# Altium schematic symbol library jlcpcb_2025_04_capacitors_extended_1206.schlib: 2503 symbols (part 14 of 14) (continued)
## TCC1206X7R681K501DT
designator C?  Capacitance: 680pF  (hidden comment: *)
Capacitor, Ceramic (MLCC), 680pF, ±10%, 500V, X7R, ±10%, SMD 1206; Manufacturer: CCTC; Manufacturer Part Number: TCC1206X7R681K501DT; Package Size: 1206; JLCPCB Basic Part: No; JLCPCB Part Number: C377115; Supplier 1: LCSC; Category: Capacitors - MLCC; Supplier Part Number 1: C377115; Tolerance: ±10%; Voltage Rating: 500V; Temperature Coefficient: X7R; RoHS: Yes; ComponentLink1Description: Datasheet; ComponentLink1URL: https://wmsc.lcsc.com/wmsc/upload/file/pdf/v2/lcsc/2304140030_CCTC-TCC1206X7R681K501DT_C377115.pdf; ComponentLink2Description: JLCPCB Part URL; ComponentLink2URL: https://jlcpcb.com/partdetail/C377115; ComponentLink3Description: LCSC Part URL; ComponentLink3URL: https://lcsc.com/product-detail/Multilayer-Ceramic-Capacitors-MLCC---SMD-SMT_CCTC-CCTC-TCC1206X7R681K501DT_C377115.html
footprint CAP-1206 (1206 (3216M) Capacitor)
pins: 1, 2

## TCC1206X7R682K102FT
designator C?  Capacitance: 6.8nF  (hidden comment: *)
Capacitor, Ceramic (MLCC), 6.8nF, ±10%, 1kV, X7R, ±10%, SMD 1206; Manufacturer: CCTC; Manufacturer Part Number: TCC1206X7R682K102FT; Package Size: 1206; JLCPCB Basic Part: No; JLCPCB Part Number: C377116; Supplier 1: LCSC; Category: Capacitors - MLCC; Supplier Part Number 1: C377116; Tolerance: ±10%; Voltage Rating: 1kV; Temperature Coefficient: X7R; RoHS: Yes; ComponentLink1Description: Datasheet; ComponentLink1URL: https://wmsc.lcsc.com/wmsc/upload/file/pdf/v2/lcsc/2304140030_CCTC-TCC1206X7R682K102FT_C377116.pdf; ComponentLink2Description: JLCPCB Part URL; ComponentLink2URL: https://jlcpcb.com/partdetail/C377116; ComponentLink3Description: LCSC Part URL; ComponentLink3URL: https://lcsc.com/product-detail/Multilayer-Ceramic-Capacitors-MLCC---SMD-SMT_CCTC-CCTC-TCC1206X7R682K102FT_C377116.html
footprint CAP-1206 (1206 (3216M) Capacitor)
pins: 1, 2

## TCC1206X7R683K500DT
designator C?  Capacitance: 68nF  (hidden comment: *)
Capacitor, Ceramic (MLCC), 68nF, ±10%, 50V, X7R, ±10%, SMD 1206; Manufacturer: CCTC; Manufacturer Part Number: TCC1206X7R683K500DT; Package Size: 1206; JLCPCB Basic Part: No; JLCPCB Part Number: C282881; Supplier 1: LCSC; Category: Capacitors - MLCC; Supplier Part Number 1: C282881; Tolerance: ±10%; Voltage Rating: 50V; Temperature Coefficient: X7R; RoHS: Yes; ComponentLink1Description: Datasheet; ComponentLink1URL: https://wmsc.lcsc.com/wmsc/upload/file/pdf/v2/lcsc/2304140030_CCTC-TCC1206X7R683K500DT_C282881.pdf; ComponentLink2Description: JLCPCB Part URL; ComponentLink2URL: https://jlcpcb.com/partdetail/C282881; ComponentLink3Description: LCSC Part URL; ComponentLink3URL: https://lcsc.com/product-detail/Multilayer-Ceramic-Capacitors-MLCC---SMD-SMT_CCTC-CCTC-TCC1206X7R683K500DT_C282881.html
footprint CAP-1206 (1206 (3216M) Capacitor)
pins: 1, 2

## TCC1206X7R683K501HT
designator C?  Capacitance: 68nF  (hidden comment: *)
Capacitor, Ceramic (MLCC), 68nF, ±10%, 500V, X7R, ±10%, SMD 1206; Manufacturer: CCTC; Manufacturer Part Number: TCC1206X7R683K501HT; Package Size: 1206; JLCPCB Basic Part: No; JLCPCB Part Number: C7393999; Supplier 1: LCSC; Category: Capacitors - MLCC; Supplier Part Number 1: C7393999; Tolerance: ±10%; Voltage Rating: 500V; Temperature Coefficient: X7R; RoHS: Yes; ComponentLink1Description: Datasheet; ComponentLink1URL: https://wmsc.lcsc.com/wmsc/upload/file/pdf/v2/lcsc/2306211528_CCTC-TCC1206X7R683K501HT_C7393999.pdf; ComponentLink2Description: JLCPCB Part URL; ComponentLink2URL: https://jlcpcb.com/partdetail/C7393999; ComponentLink3Description: LCSC Part URL; ComponentLink3URL: https://lcsc.com/product-detail/Multilayer-Ceramic-Capacitors-MLCC---SMD-SMT_CCTC-CCTC-TCC1206X7R683K501HT_C7393999.html
footprint CAP-1206 (1206 (3216M) Capacitor)
pins: 1, 2

## TCC1206X7R684K500FT
designator C?  Capacitance: 680nF  (hidden comment: *)
Capacitor, Ceramic (MLCC), 680nF, ±10%, 50V, X7R, ±10%, SMD 1206; Manufacturer: CCTC; Manufacturer Part Number: TCC1206X7R684K500FT; Package Size: 1206; JLCPCB Basic Part: No; JLCPCB Part Number: C377117; Supplier 1: LCSC; Category: Capacitors - MLCC; Supplier Part Number 1: C377117; Tolerance: ±10%; Voltage Rating: 50V; Temperature Coefficient: X7R; RoHS: Yes; ComponentLink1Description: Datasheet; ComponentLink1URL: https://wmsc.lcsc.com/wmsc/upload/file/pdf/v2/lcsc/2304140030_CCTC-TCC1206X7R684K500FT_C377117.pdf; ComponentLink2Description: JLCPCB Part URL; ComponentLink2URL: https://jlcpcb.com/partdetail/C377117; ComponentLink3Description: LCSC Part URL; ComponentLink3URL: https://lcsc.com/product-detail/Multilayer-Ceramic-Capacitors-MLCC---SMD-SMT_CCTC-CCTC-TCC1206X7R684K500FT_C377117.html
footprint CAP-1206 (1206 (3216M) Capacitor)
pins: 1, 2

## TCC1206X7R822K500DT
designator C?  Capacitance: 8.2nF  (hidden comment: *)
Capacitor, Ceramic (MLCC), 8.2nF, ±10%, 50V, X7R, ±10%, SMD 1206; Manufacturer: CCTC; Manufacturer Part Number: TCC1206X7R822K500DT; Package Size: 1206; JLCPCB Basic Part: No; JLCPCB Part Number: C282884; Supplier 1: LCSC; Category: Capacitors - MLCC; Supplier Part Number 1: C282884; Tolerance: ±10%; Voltage Rating: 50V; Temperature Coefficient: X7R; RoHS: Yes; ComponentLink1Description: Datasheet; ComponentLink1URL: https://wmsc.lcsc.com/wmsc/upload/file/pdf/v2/lcsc/2304140030_CCTC-TCC1206X7R822K500DT_C282884.pdf; ComponentLink2Description: JLCPCB Part URL; ComponentLink2URL: https://jlcpcb.com/partdetail/C282884; ComponentLink3Description: LCSC Part URL; ComponentLink3URL: https://lcsc.com/product-detail/Multilayer-Ceramic-Capacitors-MLCC---SMD-SMT_CCTC-CCTC-TCC1206X7R822K500DT_C282884.html
footprint CAP-1206 (1206 (3216M) Capacitor)
pins: 1, 2

## TCC1206X7R823K251FT
designator C?  Capacitance: 82nF  (hidden comment: *)
Capacitor, Ceramic (MLCC), 82nF, ±10%, 250V, X7R, ±10%, SMD 1206; Manufacturer: CCTC; Manufacturer Part Number: TCC1206X7R823K251FT; Package Size: 1206; JLCPCB Basic Part: No; JLCPCB Part Number: C7394002; Supplier 1: LCSC; Category: Capacitors - MLCC; Supplier Part Number 1: C7394002; Tolerance: ±10%; Voltage Rating: 250V; Temperature Coefficient: X7R; RoHS: Yes; ComponentLink1Description: Datasheet; ComponentLink1URL: https://wmsc.lcsc.com/wmsc/upload/file/pdf/v2/lcsc/2306061505_CCTC-TCC1206X7R823K251FT_C7394002.pdf; ComponentLink2Description: JLCPCB Part URL; ComponentLink2URL: https://jlcpcb.com/partdetail/C7394002; ComponentLink3Description: LCSC Part URL; ComponentLink3URL: https://lcsc.com/product-detail/Multilayer-Ceramic-Capacitors-MLCC---SMD-SMT_CCTC-CCTC-TCC1206X7R823K251FT_C7394002.html
footprint CAP-1206 (1206 (3216M) Capacitor)
pins: 1, 2

## TCC1206X7R823K500DT
designator C?  Capacitance: 82nF  (hidden comment: *)
Capacitor, Ceramic (MLCC), 82nF, ±10%, 50V, X7R, ±10%, SMD 1206; Manufacturer: CCTC; Manufacturer Part Number: TCC1206X7R823K500DT; Package Size: 1206; JLCPCB Basic Part: No; JLCPCB Part Number: C282885; Supplier 1: LCSC; Category: Capacitors - MLCC; Supplier Part Number 1: C282885; Tolerance: ±10%; Voltage Rating: 50V; Temperature Coefficient: X7R; RoHS: Yes; ComponentLink1Description: Datasheet; ComponentLink1URL: https://wmsc.lcsc.com/wmsc/upload/file/pdf/v2/lcsc/2304140030_CCTC-TCC1206X7R823K500DT_C282885.pdf; ComponentLink2Description: JLCPCB Part URL; ComponentLink2URL: https://jlcpcb.com/partdetail/C282885; ComponentLink3Description: LCSC Part URL; ComponentLink3URL: https://lcsc.com/product-detail/Multilayer-Ceramic-Capacitors-MLCC---SMD-SMT_CCTC-CCTC-TCC1206X7R823K500DT_C282885.html
footprint CAP-1206 (1206 (3216M) Capacitor)
pins: 1, 2

## TMK316AB7106KL-T
designator C?  Capacitance: 10uF  (hidden comment: *)
Capacitor, Ceramic (MLCC), 10uF, ±10%, 25V, X7R, ±10%, SMD 1206; Manufacturer: Taiyo Yuden; Manufacturer Part Number: TMK316AB7106KL-T; Package Size: 1206; JLCPCB Basic Part: No; JLCPCB Part Number: C337446; Supplier 1: LCSC; Category: Capacitors - MLCC; Supplier Part Number 1: C337446; Tolerance: ±10%; Voltage Rating: 25V; Temperature Coefficient: X7R; RoHS: Yes; ComponentLink1Description: Datasheet; ComponentLink1URL: https://wmsc.lcsc.com/wmsc/upload/file/pdf/v2/lcsc/2304140030_Taiyo-Yuden-TMK316AB7106KL-T_C337446.pdf; ComponentLink2Description: JLCPCB Part URL; ComponentLink2URL: https://jlcpcb.com/partdetail/C337446; ComponentLink3Description: LCSC Part URL; ComponentLink3URL: https://lcsc.com/product-detail/Multilayer-Ceramic-Capacitors-MLCC---SMD-SMT_Taiyo-Yuden-Taiyo-Yuden-TMK316AB7106KL-T_C337446.html
footprint CAP-1206 (1206 (3216M) Capacitor)
pins: 1, 2

## TMK316AB7475KD-T
designator C?  Capacitance: 4.7uF  (hidden comment: *)
Capacitor, Ceramic (MLCC), 4.7uF, ±10%, 25V, X7R, ±10%, SMD 1206; Manufacturer: Taiyo Yuden; Manufacturer Part Number: TMK316AB7475KD-T; Package Size: 1206; JLCPCB Basic Part: No; JLCPCB Part Number: C2171046; Supplier 1: LCSC; Category: Capacitors - MLCC; Supplier Part Number 1: C2171046; Tolerance: ±10%; Voltage Rating: 25V; Temperature Coefficient: X7R; RoHS: Yes; ComponentLink1Description: Datasheet; ComponentLink1URL: https://wmsc.lcsc.com/wmsc/upload/file/pdf/v2/lcsc/2211282030_Taiyo-Yuden-TMK316AB7475KD-T_C2171046.pdf; ComponentLink2Description: JLCPCB Part URL; ComponentLink2URL: https://jlcpcb.com/partdetail/C2171046; ComponentLink3Description: LCSC Part URL; ComponentLink3URL: https://lcsc.com/product-detail/Multilayer-Ceramic-Capacitors-MLCC---SMD-SMT_Taiyo-Yuden-Taiyo-Yuden-TMK316AB7475KD-T_C2171046.html
footprint CAP-1206 (1206 (3216M) Capacitor)
pins: 1, 2

## TMK316AB7475KL-T
designator C?  Capacitance: 4.7uF  (hidden comment: *)
Capacitor, Ceramic (MLCC), 4.7uF, ±10%, 25V, X7R, ±10%, SMD 1206; Manufacturer: Taiyo Yuden; Manufacturer Part Number: TMK316AB7475KL-T; Package Size: 1206; JLCPCB Basic Part: No; JLCPCB Part Number: C337441; Supplier 1: LCSC; Category: Capacitors - MLCC; Supplier Part Number 1: C337441; Tolerance: ±10%; Voltage Rating: 25V; Temperature Coefficient: X7R; RoHS: Yes; ComponentLink1Description: Datasheet; ComponentLink1URL: https://wmsc.lcsc.com/wmsc/upload/file/pdf/v2/lcsc/2304140030_Taiyo-Yuden-TMK316AB7475KL-T_C337441.pdf; ComponentLink2Description: JLCPCB Part URL; ComponentLink2URL: https://jlcpcb.com/partdetail/C337441; ComponentLink3Description: LCSC Part URL; ComponentLink3URL: https://lcsc.com/product-detail/Multilayer-Ceramic-Capacitors-MLCC---SMD-SMT_Taiyo-Yuden-Taiyo-Yuden-TMK316AB7475KL-T_C337441.html
footprint CAP-1206 (1206 (3216M) Capacitor)
pins: 1, 2

## TMK316AB7475KLHT
designator C?  Capacitance: 4.7uF  (hidden comment: *)
Capacitor, Ceramic (MLCC), 4.7uF, ±10%, 25V, X7R, ±10%, SMD 1206; Manufacturer: Taiyo Yuden; Manufacturer Part Number: TMK316AB7475KLHT; Package Size: 1206; JLCPCB Basic Part: No; JLCPCB Part Number: C386090; Supplier 1: LCSC; Category: Capacitors - MLCC; Supplier Part Number 1: C386090; Tolerance: ±10%; Voltage Rating: 25V; Temperature Coefficient: X7R; RoHS: Yes; ComponentLink1Description: Datasheet; ComponentLink1URL: https://wmsc.lcsc.com/wmsc/upload/file/pdf/v2/lcsc/2211282230_Taiyo-Yuden-TMK316AB7475KLHT_C386090.pdf; ComponentLink2Description: JLCPCB Part URL; ComponentLink2URL: https://jlcpcb.com/partdetail/C386090; ComponentLink3Description: LCSC Part URL; ComponentLink3URL: https://lcsc.com/product-detail/Multilayer-Ceramic-Capacitors-MLCC---SMD-SMT_Taiyo-Yuden-Taiyo-Yuden-TMK316AB7475KLHT_C386090.html
footprint CAP-1206 (1206 (3216M) Capacitor)
pins: 1, 2

## TMK316B7106KL-TD
designator C?  Capacitance: 10uF  (hidden comment: *)
Capacitor, Ceramic (MLCC), 10uF, ±10%, 25V, X7R, ±10%, SMD 1206; Manufacturer: Taiyo Yuden; Manufacturer Part Number: TMK316B7106KL-TD; Package Size: 1206; JLCPCB Basic Part: No; JLCPCB Part Number: C92831; Supplier 1: LCSC; Category: Capacitors - MLCC; Supplier Part Number 1: C92831; Tolerance: ±10%; Voltage Rating: 25V; Temperature Coefficient: X7R; RoHS: Yes; ComponentLink1Description: Datasheet; ComponentLink1URL: https://wmsc.lcsc.com/wmsc/upload/file/pdf/v2/lcsc/2304140030_Taiyo-Yuden-TMK316B7106KL-TD_C92831.pdf; ComponentLink2Description: JLCPCB Part URL; ComponentLink2URL: https://jlcpcb.com/partdetail/C92831; ComponentLink3Description: LCSC Part URL; ComponentLink3URL: https://lcsc.com/product-detail/Multilayer-Ceramic-Capacitors-MLCC---SMD-SMT_Taiyo-Yuden-Taiyo-Yuden-TMK316B7106KL-TD_C92831.html
footprint CAP-1206 (1206 (3216M) Capacitor)
pins: 1, 2

## TMK316B7225KL-T
designator C?  Capacitance: 2.2uF  (hidden comment: *)
Capacitor, Ceramic (MLCC), 2.2uF, ±10%, 25V, X7R, ±10%, SMD 1206; Manufacturer: Taiyo Yuden; Manufacturer Part Number: TMK316B7225KL-T; Package Size: 1206; JLCPCB Basic Part: No; JLCPCB Part Number: C386092; Supplier 1: LCSC; Category: Capacitors - MLCC; Supplier Part Number 1: C386092; Tolerance: ±10%; Voltage Rating: 25V; Temperature Coefficient: X7R; RoHS: Yes; ComponentLink1Description: Datasheet; ComponentLink1URL: https://wmsc.lcsc.com/wmsc/upload/file/pdf/v2/lcsc/2304140030_Taiyo-Yuden-TMK316B7225KL-T_C386092.pdf; ComponentLink2Description: JLCPCB Part URL; ComponentLink2URL: https://jlcpcb.com/partdetail/C386092; ComponentLink3Description: LCSC Part URL; ComponentLink3URL: https://lcsc.com/product-detail/Multilayer-Ceramic-Capacitors-MLCC---SMD-SMT_Taiyo-Yuden-Taiyo-Yuden-TMK316B7225KL-T_C386092.html
footprint CAP-1206 (1206 (3216M) Capacitor)
pins: 1, 2

## TMK316B7225KLHT
designator C?  Capacitance: 2.2uF  (hidden comment: *)
Capacitor, Ceramic (MLCC), 2.2uF, ±10%, 25V, X7R, ±10%, SMD 1206; Manufacturer: Taiyo Yuden; Manufacturer Part Number: TMK316B7225KLHT; Package Size: 1206; JLCPCB Basic Part: No; JLCPCB Part Number: C655210; Supplier 1: LCSC; Category: Capacitors - MLCC; Supplier Part Number 1: C655210; Tolerance: ±10%; Voltage Rating: 25V; Temperature Coefficient: X7R; RoHS: Yes; ComponentLink1Description: Datasheet; ComponentLink1URL: https://wmsc.lcsc.com/wmsc/upload/file/pdf/v2/lcsc/2304140030_Taiyo-Yuden-TMK316B7225KLHT_C655210.pdf; ComponentLink2Description: JLCPCB Part URL; ComponentLink2URL: https://jlcpcb.com/partdetail/C655210; ComponentLink3Description: LCSC Part URL; ComponentLink3URL: https://lcsc.com/product-detail/Multilayer-Ceramic-Capacitors-MLCC---SMD-SMT_Taiyo-Yuden-Taiyo-Yuden-TMK316B7225KLHT_C655210.html
footprint CAP-1206 (1206 (3216M) Capacitor)
pins: 1, 2

## TMK316BBJ226KL-T
designator C?  Capacitance: 22uF  (hidden comment: *)
Capacitor, Ceramic (MLCC), 22uF, ±10%, 25V, ±10%, SMD 1206; Manufacturer: Taiyo Yuden; Manufacturer Part Number: TMK316BBJ226KL-T; Package Size: 1206; JLCPCB Basic Part: No; JLCPCB Part Number: C778724; Supplier 1: LCSC; Category: Capacitors - MLCC; Supplier Part Number 1: C778724; Tolerance: ±10%; Voltage Rating: 25V; RoHS: Yes; ComponentLink1Description: Datasheet; ComponentLink1URL: https://wmsc.lcsc.com/wmsc/upload/file/pdf/v2/lcsc/2304140030_Taiyo-Yuden-TMK316BBJ226KL-T_C778724.pdf; ComponentLink2Description: JLCPCB Part URL; ComponentLink2URL: https://jlcpcb.com/partdetail/C778724; ComponentLink3Description: LCSC Part URL; ComponentLink3URL: https://lcsc.com/product-detail/Multilayer-Ceramic-Capacitors-MLCC---SMD-SMT_Taiyo-Yuden-Taiyo-Yuden-TMK316BBJ226KL-T_C778724.html
footprint CAP-1206 (1206 (3216M) Capacitor)
pins: 1, 2

## TMK316BBJ226ML-T
designator C?  Capacitance: 22uF  (hidden comment: *)
Capacitor, Ceramic (MLCC), 22uF, ±20%, 25V, X5R, ±20%, SMD 1206; Manufacturer: Taiyo Yuden; Manufacturer Part Number: TMK316BBJ226ML-T; Package Size: 1206; JLCPCB Basic Part: No; JLCPCB Part Number: C386093; Supplier 1: LCSC; Category: Capacitors - MLCC; Supplier Part Number 1: C386093; Tolerance: ±20%; Voltage Rating: 25V; Temperature Coefficient: X5R; RoHS: Yes; ComponentLink1Description: Datasheet; ComponentLink1URL: https://wmsc.lcsc.com/wmsc/upload/file/pdf/v2/lcsc/2304140030_Taiyo-Yuden-TMK316BBJ226ML-T_C386093.pdf; ComponentLink2Description: JLCPCB Part URL; ComponentLink2URL: https://jlcpcb.com/partdetail/C386093; ComponentLink3Description: LCSC Part URL; ComponentLink3URL: https://lcsc.com/product-detail/Multilayer-Ceramic-Capacitors-MLCC---SMD-SMT_Taiyo-Yuden-Taiyo-Yuden-TMK316BBJ226ML-T_C386093.html
footprint CAP-1206 (1206 (3216M) Capacitor)
pins: 1, 2

## TMK316BJ105KD-T
designator C?  Capacitance: 1uF  (hidden comment: *)
Capacitor, Ceramic (MLCC), 1uF, ±10%, 25V, X5R, ±10%, SMD 1206; Manufacturer: Taiyo Yuden; Manufacturer Part Number: TMK316BJ105KD-T; Package Size: 1206; JLCPCB Basic Part: No; JLCPCB Part Number: C412632; Supplier 1: LCSC; Category: Capacitors - MLCC; Supplier Part Number 1: C412632; Tolerance: ±10%; Voltage Rating: 25V; Temperature Coefficient: X5R; RoHS: Yes; ComponentLink1Description: Datasheet; ComponentLink1URL: https://wmsc.lcsc.com/wmsc/upload/file/pdf/v2/lcsc/2304140030_Taiyo-Yuden-TMK316BJ105KD-T_C412632.pdf; ComponentLink2Description: JLCPCB Part URL; ComponentLink2URL: https://jlcpcb.com/partdetail/C412632; ComponentLink3Description: LCSC Part URL; ComponentLink3URL: https://lcsc.com/product-detail/Multilayer-Ceramic-Capacitors-MLCC---SMD-SMT_Taiyo-Yuden-Taiyo-Yuden-TMK316BJ105KD-T_C412632.html
footprint CAP-1206 (1206 (3216M) Capacitor)
pins: 1, 2

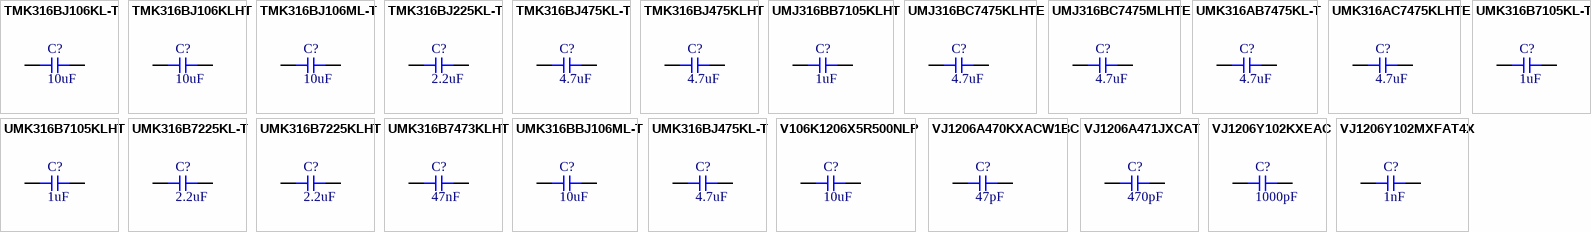
[diagram p62: symbols TMK316BJ106KL-T to VJ1206Y102MXFAT4X]

## TMK316BJ106KL-T
designator C?  Capacitance: 10uF  (hidden comment: *)
Capacitor, Ceramic (MLCC), 10uF, ±10%, 25V, X5R, ±10%, SMD 1206; Manufacturer: Taiyo Yuden; Manufacturer Part Number: TMK316BJ106KL-T; Package Size: 1206; JLCPCB Basic Part: No; JLCPCB Part Number: C87161; Supplier 1: LCSC; Category: Capacitors - MLCC; Supplier Part Number 1: C87161; Tolerance: ±10%; Voltage Rating: 25V; Temperature Coefficient: X5R; RoHS: Yes; ComponentLink1Description: Datasheet; ComponentLink1URL: https://wmsc.lcsc.com/wmsc/upload/file/pdf/v2/lcsc/2304140030_Taiyo-Yuden-TMK316BJ106KL-T_C87161.pdf; ComponentLink2Description: JLCPCB Part URL; ComponentLink2URL: https://jlcpcb.com/partdetail/C87161; ComponentLink3Description: LCSC Part URL; ComponentLink3URL: https://lcsc.com/product-detail/Multilayer-Ceramic-Capacitors-MLCC---SMD-SMT_Taiyo-Yuden-Taiyo-Yuden-TMK316BJ106KL-T_C87161.html
footprint CAP-1206 (1206 (3216M) Capacitor)
pins: 1, 2

## TMK316BJ106KLHT
designator C?  Capacitance: 10uF  (hidden comment: *)
Capacitor, Ceramic (MLCC), 10uF, ±10%, 25V, X5R, ±10%, SMD 1206; Manufacturer: Taiyo Yuden; Manufacturer Part Number: TMK316BJ106KLHT; Package Size: 1206; JLCPCB Basic Part: No; JLCPCB Part Number: C841053; Supplier 1: LCSC; Category: Capacitors - MLCC; Supplier Part Number 1: C841053; Tolerance: ±10%; Voltage Rating: 25V; Temperature Coefficient: X5R; RoHS: Yes; ComponentLink1Description: Datasheet; ComponentLink1URL: https://wmsc.lcsc.com/wmsc/upload/file/pdf/v2/lcsc/2010231636_Taiyo-Yuden-TMK316BJ106KLHT_C841053.pdf; ComponentLink2Description: JLCPCB Part URL; ComponentLink2URL: https://jlcpcb.com/partdetail/C841053; ComponentLink3Description: LCSC Part URL; ComponentLink3URL: https://lcsc.com/product-detail/Multilayer-Ceramic-Capacitors-MLCC---SMD-SMT_Taiyo-Yuden-Taiyo-Yuden-TMK316BJ106KLHT_C841053.html
footprint CAP-1206 (1206 (3216M) Capacitor)
pins: 1, 2

## TMK316BJ106ML-T
designator C?  Capacitance: 10uF  (hidden comment: *)
Capacitor, Ceramic (MLCC), 10uF, ±20%, 25V, X5R, ±20%, SMD 1206; Manufacturer: Taiyo Yuden; Manufacturer Part Number: TMK316BJ106ML-T; Package Size: 1206; JLCPCB Basic Part: No; JLCPCB Part Number: C311699; Supplier 1: LCSC; Category: Capacitors - MLCC; Supplier Part Number 1: C311699; Tolerance: ±20%; Voltage Rating: 25V; Temperature Coefficient: X5R; RoHS: Yes; ComponentLink1Description: Datasheet; ComponentLink1URL: https://wmsc.lcsc.com/wmsc/upload/file/pdf/v2/lcsc/1810171714_Taiyo-Yuden-TMK316BJ106ML-T_C311699.pdf; ComponentLink2Description: JLCPCB Part URL; ComponentLink2URL: https://jlcpcb.com/partdetail/C311699; ComponentLink3Description: LCSC Part URL; ComponentLink3URL: https://lcsc.com/product-detail/Multilayer-Ceramic-Capacitors-MLCC---SMD-SMT_Taiyo-Yuden-Taiyo-Yuden-TMK316BJ106ML-T_C311699.html
footprint CAP-1206 (1206 (3216M) Capacitor)
pins: 1, 2

## TMK316BJ225KL-T
designator C?  Capacitance: 2.2uF  (hidden comment: *)
Capacitor, Ceramic (MLCC), 2.2uF, ±10%, 25V, X5R, ±10%, SMD 1206; Manufacturer: Taiyo Yuden; Manufacturer Part Number: TMK316BJ225KL-T; Package Size: 1206; JLCPCB Basic Part: No; JLCPCB Part Number: C92833; Supplier 1: LCSC; Category: Capacitors - MLCC; Supplier Part Number 1: C92833; Tolerance: ±10%; Voltage Rating: 25V; Temperature Coefficient: X5R; RoHS: Yes; ComponentLink1Description: Datasheet; ComponentLink1URL: https://wmsc.lcsc.com/wmsc/upload/file/pdf/v2/lcsc/1810301023_Taiyo-Yuden-TMK316BJ225KL-T_C92833.pdf; ComponentLink2Description: JLCPCB Part URL; ComponentLink2URL: https://jlcpcb.com/partdetail/C92833; ComponentLink3Description: LCSC Part URL; ComponentLink3URL: https://lcsc.com/product-detail/Multilayer-Ceramic-Capacitors-MLCC---SMD-SMT_Taiyo-Yuden-Taiyo-Yuden-TMK316BJ225KL-T_C92833.html
footprint CAP-1206 (1206 (3216M) Capacitor)
pins: 1, 2

## TMK316BJ475KL-T
designator C?  Capacitance: 4.7uF  (hidden comment: *)
Capacitor, Ceramic (MLCC), 4.7uF, ±10%, 25V, X5R, ±10%, SMD 1206; Manufacturer: Taiyo Yuden; Manufacturer Part Number: TMK316BJ475KL-T; Package Size: 1206; JLCPCB Basic Part: No; JLCPCB Part Number: C337453; Supplier 1: LCSC; Category: Capacitors - MLCC; Supplier Part Number 1: C337453; Tolerance: ±10%; Voltage Rating: 25V; Temperature Coefficient: X5R; RoHS: Yes; ComponentLink1Description: Datasheet; ComponentLink1URL: https://wmsc.lcsc.com/wmsc/upload/file/pdf/v2/lcsc/2211282230_Taiyo-Yuden-TMK316BJ475KL-T_C337453.pdf; ComponentLink2Description: JLCPCB Part URL; ComponentLink2URL: https://jlcpcb.com/partdetail/C337453; ComponentLink3Description: LCSC Part URL; ComponentLink3URL: https://lcsc.com/product-detail/Multilayer-Ceramic-Capacitors-MLCC---SMD-SMT_Taiyo-Yuden-Taiyo-Yuden-TMK316BJ475KL-T_C337453.html
footprint CAP-1206 (1206 (3216M) Capacitor)
pins: 1, 2

## TMK316BJ475KLHT
designator C?  Capacitance: 4.7uF  (hidden comment: *)
Capacitor, Ceramic (MLCC), 4.7uF, ±10%, 25V, X5R, ±10%, SMD 1206; Manufacturer: Taiyo Yuden; Manufacturer Part Number: TMK316BJ475KLHT; Package Size: 1206; JLCPCB Basic Part: No; JLCPCB Part Number: C655208; Supplier 1: LCSC; Category: Capacitors - MLCC; Supplier Part Number 1: C655208; Tolerance: ±10%; Voltage Rating: 25V; Temperature Coefficient: X5R; RoHS: Yes; ComponentLink1Description: Datasheet; ComponentLink1URL: https://wmsc.lcsc.com/wmsc/upload/file/pdf/v2/lcsc/2304140030_Taiyo-Yuden-TMK316BJ475KLHT_C655208.pdf; ComponentLink2Description: JLCPCB Part URL; ComponentLink2URL: https://jlcpcb.com/partdetail/C655208; ComponentLink3Description: LCSC Part URL; ComponentLink3URL: https://lcsc.com/product-detail/Multilayer-Ceramic-Capacitors-MLCC---SMD-SMT_Taiyo-Yuden-Taiyo-Yuden-TMK316BJ475KLHT_C655208.html
footprint CAP-1206 (1206 (3216M) Capacitor)
pins: 1, 2

## UMJ316BB7105KLHT
designator C?  Capacitance: 1uF  (hidden comment: *)
Capacitor, Ceramic (MLCC), 1uF, ±10%, 50V, X7R, ±10%, SMD 1206; Manufacturer: Taiyo Yuden; Manufacturer Part Number: UMJ316BB7105KLHT; Package Size: 1206; JLCPCB Basic Part: No; JLCPCB Part Number: C2174496; Supplier 1: LCSC; Category: Capacitors - MLCC; Supplier Part Number 1: C2174496; Tolerance: ±10%; Voltage Rating: 50V; Temperature Coefficient: X7R; RoHS: Yes; ComponentLink1Description: Datasheet; ComponentLink1URL: https://wmsc.lcsc.com/wmsc/upload/file/pdf/v2/lcsc/2211282000_Taiyo-Yuden-UMJ316BB7105KLHT_C2174496.pdf; ComponentLink2Description: JLCPCB Part URL; ComponentLink2URL: https://jlcpcb.com/partdetail/C2174496; ComponentLink3Description: LCSC Part URL; ComponentLink3URL: https://lcsc.com/product-detail/Multilayer-Ceramic-Capacitors-MLCC---SMD-SMT_Taiyo-Yuden-Taiyo-Yuden-UMJ316BB7105KLHT_C2174496.html
footprint CAP-1206 (1206 (3216M) Capacitor)
pins: 1, 2

## UMJ316BC7475KLHTE
designator C?  Capacitance: 4.7uF  (hidden comment: *)
Capacitor, Ceramic (MLCC), 4.7uF, ±10%, 50V, X7S, ±10%, SMD 1206; Manufacturer: Taiyo Yuden; Manufacturer Part Number: UMJ316BC7475KLHTE; Package Size: 1206; JLCPCB Basic Part: No; JLCPCB Part Number: C412617; Supplier 1: LCSC; Category: Capacitors - MLCC; Supplier Part Number 1: C412617; Tolerance: ±10%; Voltage Rating: 50V; Temperature Coefficient: X7S; RoHS: Yes; ComponentLink1Description: Datasheet; ComponentLink1URL: https://wmsc.lcsc.com/wmsc/upload/file/pdf/v2/lcsc/2304140030_Taiyo-Yuden-UMJ316BC7475KLHTE_C412617.pdf; ComponentLink2Description: JLCPCB Part URL; ComponentLink2URL: https://jlcpcb.com/partdetail/C412617; ComponentLink3Description: LCSC Part URL; ComponentLink3URL: https://lcsc.com/product-detail/Multilayer-Ceramic-Capacitors-MLCC---SMD-SMT_Taiyo-Yuden-Taiyo-Yuden-UMJ316BC7475KLHTE_C412617.html
footprint CAP-1206 (1206 (3216M) Capacitor)
pins: 1, 2

## UMJ316BC7475MLHTE
designator C?  Capacitance: 4.7uF  (hidden comment: *)
Capacitor, Ceramic (MLCC), 4.7uF, ±20%, 50V, X7S, ±20%, SMD 1206; Manufacturer: Taiyo Yuden; Manufacturer Part Number: UMJ316BC7475MLHTE; Package Size: 1206; JLCPCB Basic Part: No; JLCPCB Part Number: C2175623; Supplier 1: LCSC; Category: Capacitors - MLCC; Supplier Part Number 1: C2175623; Tolerance: ±20%; Voltage Rating: 50V; Temperature Coefficient: X7S; RoHS: Yes; ComponentLink1Description: Datasheet; ComponentLink1URL: https://wmsc.lcsc.com/wmsc/upload/file/pdf/v2/lcsc/2211282000_Taiyo-Yuden-UMJ316BC7475MLHTE_C2175623.pdf; ComponentLink2Description: JLCPCB Part URL; ComponentLink2URL: https://jlcpcb.com/partdetail/C2175623; ComponentLink3Description: LCSC Part URL; ComponentLink3URL: https://lcsc.com/product-detail/Multilayer-Ceramic-Capacitors-MLCC---SMD-SMT_Taiyo-Yuden-Taiyo-Yuden-UMJ316BC7475MLHTE_C2175623.html
footprint CAP-1206 (1206 (3216M) Capacitor)
pins: 1, 2

## UMK316AB7475KL-T
designator C?  Capacitance: 4.7uF  (hidden comment: *)
Capacitor, Ceramic (MLCC), 4.7uF, ±10%, 50V, X7R, ±10%, SMD 1206; Manufacturer: Taiyo Yuden; Manufacturer Part Number: UMK316AB7475KL-T; Package Size: 1206; JLCPCB Basic Part: No; JLCPCB Part Number: C92853; Supplier 1: LCSC; Category: Capacitors - MLCC; Supplier Part Number 1: C92853; Tolerance: ±10%; Voltage Rating: 50V; Temperature Coefficient: X7R; RoHS: Yes; ComponentLink1Description: Datasheet; ComponentLink1URL: https://wmsc.lcsc.com/wmsc/upload/file/pdf/v2/lcsc/1912111437_Taiyo-Yuden-UMK316AB7475KL-T_C92853.pdf; ComponentLink2Description: JLCPCB Part URL; ComponentLink2URL: https://jlcpcb.com/partdetail/C92853; ComponentLink3Description: LCSC Part URL; ComponentLink3URL: https://lcsc.com/product-detail/Multilayer-Ceramic-Capacitors-MLCC---SMD-SMT_Taiyo-Yuden-Taiyo-Yuden-UMK316AB7475KL-T_C92853.html
footprint CAP-1206 (1206 (3216M) Capacitor)
pins: 1, 2

## UMK316AC7475KLHTE
designator C?  Capacitance: 4.7uF  (hidden comment: *)
Capacitor, Ceramic (MLCC), 4.7uF, ±10%, 50V, ±10%, SMD 1206; Manufacturer: Taiyo Yuden; Manufacturer Part Number: UMK316AC7475KLHTE; Package Size: 1206; JLCPCB Basic Part: No; JLCPCB Part Number: C386162; Supplier 1: LCSC; Category: Capacitors - MLCC; Supplier Part Number 1: C386162; Tolerance: ±10%; Voltage Rating: 50V; RoHS: Yes; ComponentLink1Description: Datasheet; ComponentLink1URL: https://wmsc.lcsc.com/wmsc/upload/file/pdf/v2/lcsc/2211282230_Taiyo-Yuden-UMK316AC7475KLHTE_C386162.pdf; ComponentLink2Description: JLCPCB Part URL; ComponentLink2URL: https://jlcpcb.com/partdetail/C386162; ComponentLink3Description: LCSC Part URL; ComponentLink3URL: https://lcsc.com/product-detail/Multilayer-Ceramic-Capacitors-MLCC---SMD-SMT_Taiyo-Yuden-Taiyo-Yuden-UMK316AC7475KLHTE_C386162.html
footprint CAP-1206 (1206 (3216M) Capacitor)
pins: 1, 2

## UMK316B7105KL-T
designator C?  Capacitance: 1uF  (hidden comment: *)
Capacitor, Ceramic (MLCC), 1uF, ±10%, 50V, X7R, ±10%, SMD 1206; Manufacturer: Taiyo Yuden; Manufacturer Part Number: UMK316B7105KL-T; Package Size: 1206; JLCPCB Basic Part: No; JLCPCB Part Number: C386164; Supplier 1: LCSC; Category: Capacitors - MLCC; Supplier Part Number 1: C386164; Tolerance: ±10%; Voltage Rating: 50V; Temperature Coefficient: X7R; RoHS: Yes; ComponentLink1Description: Datasheet; ComponentLink1URL: https://wmsc.lcsc.com/wmsc/upload/file/pdf/v2/lcsc/2211282230_Taiyo-Yuden-UMK316B7105KL-T_C386164.pdf; ComponentLink2Description: JLCPCB Part URL; ComponentLink2URL: https://jlcpcb.com/partdetail/C386164; ComponentLink3Description: LCSC Part URL; ComponentLink3URL: https://lcsc.com/product-detail/Multilayer-Ceramic-Capacitors-MLCC---SMD-SMT_Taiyo-Yuden-Taiyo-Yuden-UMK316B7105KL-T_C386164.html
footprint CAP-1206 (1206 (3216M) Capacitor)
pins: 1, 2

## UMK316B7105KLHT
designator C?  Capacitance: 1uF  (hidden comment: *)
Capacitor, Ceramic (MLCC), 1uF, ±10%, 50V, ±10%, SMD 1206; Manufacturer: Taiyo Yuden; Manufacturer Part Number: UMK316B7105KLHT; Package Size: 1206; JLCPCB Basic Part: No; JLCPCB Part Number: C386163; Supplier 1: LCSC; Category: Capacitors - MLCC; Supplier Part Number 1: C386163; Tolerance: ±10%; Voltage Rating: 50V; RoHS: Yes; ComponentLink1Description: Datasheet; ComponentLink1URL: https://wmsc.lcsc.com/wmsc/upload/file/pdf/v2/lcsc/2211282230_Taiyo-Yuden-UMK316B7105KLHT_C386163.pdf; ComponentLink2Description: JLCPCB Part URL; ComponentLink2URL: https://jlcpcb.com/partdetail/C386163; ComponentLink3Description: LCSC Part URL; ComponentLink3URL: https://lcsc.com/product-detail/Multilayer-Ceramic-Capacitors-MLCC---SMD-SMT_Taiyo-Yuden-Taiyo-Yuden-UMK316B7105KLHT_C386163.html
footprint CAP-1206 (1206 (3216M) Capacitor)
pins: 1, 2

## UMK316B7225KL-T
designator C?  Capacitance: 2.2uF  (hidden comment: *)
Capacitor, Ceramic (MLCC), 2.2uF, ±10%, 50V, X7R, ±10%, SMD 1206; Manufacturer: Taiyo Yuden; Manufacturer Part Number: UMK316B7225KL-T; Package Size: 1206; JLCPCB Basic Part: No; JLCPCB Part Number: C92854; Supplier 1: LCSC; Category: Capacitors - MLCC; Supplier Part Number 1: C92854; Tolerance: ±10%; Voltage Rating: 50V; Temperature Coefficient: X7R; RoHS: Yes; ComponentLink1Description: Datasheet; ComponentLink1URL: https://wmsc.lcsc.com/wmsc/upload/file/pdf/v2/lcsc/1810171712_Taiyo-Yuden-UMK316B7225KL-T_C92854.pdf; ComponentLink2Description: JLCPCB Part URL; ComponentLink2URL: https://jlcpcb.com/partdetail/C92854; ComponentLink3Description: LCSC Part URL; ComponentLink3URL: https://lcsc.com/product-detail/Multilayer-Ceramic-Capacitors-MLCC---SMD-SMT_Taiyo-Yuden-Taiyo-Yuden-UMK316B7225KL-T_C92854.html
footprint CAP-1206 (1206 (3216M) Capacitor)
pins: 1, 2

## UMK316B7225KLHT
designator C?  Capacitance: 2.2uF  (hidden comment: *)
Capacitor, Ceramic (MLCC), 2.2uF, ±10%, 50V, X7R, ±10%, SMD 1206; Manufacturer: Taiyo Yuden; Manufacturer Part Number: UMK316B7225KLHT; Package Size: 1206; JLCPCB Basic Part: No; JLCPCB Part Number: C386165; Supplier 1: LCSC; Category: Capacitors - MLCC; Supplier Part Number 1: C386165; Tolerance: ±10%; Voltage Rating: 50V; Temperature Coefficient: X7R; RoHS: Yes; ComponentLink1Description: Datasheet; ComponentLink1URL: https://wmsc.lcsc.com/wmsc/upload/file/pdf/v2/lcsc/2108160930_Taiyo-Yuden-UMK316B7225KLHT_C386165.pdf; ComponentLink2Description: JLCPCB Part URL; ComponentLink2URL: https://jlcpcb.com/partdetail/C386165; ComponentLink3Description: LCSC Part URL; ComponentLink3URL: https://lcsc.com/product-detail/Multilayer-Ceramic-Capacitors-MLCC---SMD-SMT_Taiyo-Yuden-Taiyo-Yuden-UMK316B7225KLHT_C386165.html
footprint CAP-1206 (1206 (3216M) Capacitor)
pins: 1, 2

## UMK316B7473KLHT
designator C?  Capacitance: 47nF  (hidden comment: *)
Capacitor, Ceramic (MLCC), 47nF, ±10%, 50V, X7R, ±10%, SMD 1206; Manufacturer: Taiyo Yuden; Manufacturer Part Number: UMK316B7473KLHT; Package Size: 1206; JLCPCB Basic Part: No; JLCPCB Part Number: C2176554; Supplier 1: LCSC; Category: Capacitors - MLCC; Supplier Part Number 1: C2176554; Tolerance: ±10%; Voltage Rating: 50V; Temperature Coefficient: X7R; RoHS: Yes; ComponentLink1Description: Datasheet; ComponentLink1URL: https://wmsc.lcsc.com/wmsc/upload/file/pdf/v2/lcsc/2211282000_Taiyo-Yuden-UMK316B7473KLHT_C2176554.pdf; ComponentLink2Description: JLCPCB Part URL; ComponentLink2URL: https://jlcpcb.com/partdetail/C2176554; ComponentLink3Description: LCSC Part URL; ComponentLink3URL: https://lcsc.com/product-detail/Multilayer-Ceramic-Capacitors-MLCC---SMD-SMT_Taiyo-Yuden-Taiyo-Yuden-UMK316B7473KLHT_C2176554.html
footprint CAP-1206 (1206 (3216M) Capacitor)
pins: 1, 2

## UMK316BBJ106ML-T
designator C?  Capacitance: 10uF  (hidden comment: *)
Capacitor, Ceramic (MLCC), 10uF, ±20%, 50V, X5R, ±20%, SMD 1206; Manufacturer: Taiyo Yuden; Manufacturer Part Number: UMK316BBJ106ML-T; Package Size: 1206; JLCPCB Basic Part: No; JLCPCB Part Number: C97712; Supplier 1: LCSC; Category: Capacitors - MLCC; Supplier Part Number 1: C97712; Tolerance: ±20%; Voltage Rating: 50V; Temperature Coefficient: X5R; RoHS: Yes; ComponentLink1Description: Datasheet; ComponentLink1URL: https://wmsc.lcsc.com/wmsc/upload/file/pdf/v2/lcsc/2211282300_Taiyo-Yuden-UMK316BBJ106ML-T_C97712.pdf; ComponentLink2Description: JLCPCB Part URL; ComponentLink2URL: https://jlcpcb.com/partdetail/C97712; ComponentLink3Description: LCSC Part URL; ComponentLink3URL: https://lcsc.com/product-detail/Multilayer-Ceramic-Capacitors-MLCC---SMD-SMT_Taiyo-Yuden-Taiyo-Yuden-UMK316BBJ106ML-T_C97712.html
footprint CAP-1206 (1206 (3216M) Capacitor)
pins: 1, 2

## UMK316BJ475KL-T
designator C?  Capacitance: 4.7uF  (hidden comment: *)
Capacitor, Ceramic (MLCC), 4.7uF, ±10%, 50V, X5R, ±10%, SMD 1206; Manufacturer: Taiyo Yuden; Manufacturer Part Number: UMK316BJ475KL-T; Package Size: 1206; JLCPCB Basic Part: No; JLCPCB Part Number: C92855; Supplier 1: LCSC; Category: Capacitors - MLCC; Supplier Part Number 1: C92855; Tolerance: ±10%; Voltage Rating: 50V; Temperature Coefficient: X5R; RoHS: Yes; ComponentLink1Description: Datasheet; ComponentLink1URL: https://wmsc.lcsc.com/wmsc/upload/file/pdf/v2/lcsc/2201242300_Taiyo-Yuden-UMK316BJ475KL-T_C92855.pdf; ComponentLink2Description: JLCPCB Part URL; ComponentLink2URL: https://jlcpcb.com/partdetail/C92855; ComponentLink3Description: LCSC Part URL; ComponentLink3URL: https://lcsc.com/product-detail/Multilayer-Ceramic-Capacitors-MLCC---SMD-SMT_Taiyo-Yuden-Taiyo-Yuden-UMK316BJ475KL-T_C92855.html
footprint CAP-1206 (1206 (3216M) Capacitor)
pins: 1, 2

## V106K1206X5R500NLP
designator C?  Capacitance: 10uF  (hidden comment: *)
Capacitor, Ceramic (MLCC), 10uF, ±10%, 50V, X5R, ±10%, SMD 1206; Manufacturer: VIIYONG; Manufacturer Part Number: V106K1206X5R500NLP; Package Size: 1206; JLCPCB Basic Part: No; JLCPCB Part Number: C2976058; Supplier 1: LCSC; Category: Capacitors - MLCC; Supplier Part Number 1: C2976058; Tolerance: ±10%; Voltage Rating: 50V; Temperature Coefficient: X5R; RoHS: Yes; ComponentLink1Description: Datasheet; ComponentLink1URL: https://wmsc.lcsc.com/wmsc/upload/file/pdf/v2/lcsc/2202211830_VIIYONG-V106K1206X5R500NLP_C2976058.pdf; ComponentLink2Description: JLCPCB Part URL; ComponentLink2URL: https://jlcpcb.com/partdetail/C2976058; ComponentLink3Description: LCSC Part URL; ComponentLink3URL: https://lcsc.com/product-detail/Multilayer-Ceramic-Capacitors-MLCC---SMD-SMT_VIIYONG-VIIYONG-V106K1206X5R500NLP_C2976058.html
footprint CAP-1206 (1206 (3216M) Capacitor)
pins: 1, 2

## VJ1206A470KXACW1BC
designator C?  Capacitance: 47pF  (hidden comment: *)
Capacitor, Ceramic (MLCC), 47pF, ±10%, 50V, C0G, ±10%, SMD 1206; Manufacturer: Vishay Intertech; Manufacturer Part Number: VJ1206A470KXACW1BC; Package Size: 1206; JLCPCB Basic Part: No; JLCPCB Part Number: C2227477; Supplier 1: LCSC; Category: Capacitors - MLCC; Supplier Part Number 1: C2227477; Tolerance: ±10%; Voltage Rating: 50V; Temperature Coefficient: C0G; RoHS: Yes; ComponentLink1Description: Datasheet; ComponentLink1URL: https://wmsc.lcsc.com/wmsc/upload/file/pdf/v2/lcsc/2304140030_Vishay-Intertech-VJ1206A470KXACW1BC_C2227477.pdf; ComponentLink2Description: JLCPCB Part URL; ComponentLink2URL: https://jlcpcb.com/partdetail/C2227477; ComponentLink3Description: LCSC Part URL; ComponentLink3URL: https://lcsc.com/product-detail/Multilayer-Ceramic-Capacitors-MLCC---SMD-SMT_Vishay-Intertech-Vishay-Intertech-VJ1206A470KXACW1BC_C2227477.html
footprint CAP-1206 (1206 (3216M) Capacitor)
pins: 1, 2

## VJ1206A471JXCAT
designator C?  Capacitance: 470pF  (hidden comment: *)
Capacitor, Ceramic (MLCC), 470pF, ±5%, 200V, C0G, ±5%, SMD 1206; Manufacturer: Vishay Intertech; Manufacturer Part Number: VJ1206A471JXCAT; Package Size: 1206; JLCPCB Basic Part: No; JLCPCB Part Number: C511603; Supplier 1: LCSC; Category: Capacitors - MLCC; Supplier Part Number 1: C511603; Tolerance: ±5%; Voltage Rating: 200V; Temperature Coefficient: C0G; RoHS: Yes; ComponentLink1Description: Datasheet; ComponentLink1URL: https://wmsc.lcsc.com/wmsc/upload/file/pdf/v2/lcsc/2005201835_Vishay-Intertech-VJ1206A471JXCAT_C511603.pdf; ComponentLink2Description: JLCPCB Part URL; ComponentLink2URL: https://jlcpcb.com/partdetail/C511603; ComponentLink3Description: LCSC Part URL; ComponentLink3URL: https://lcsc.com/product-detail/Multilayer-Ceramic-Capacitors-MLCC---SMD-SMT_Vishay-Intertech-Vishay-Intertech-VJ1206A471JXCAT_C511603.html
footprint CAP-1206 (1206 (3216M) Capacitor)
pins: 1, 2

## VJ1206Y102KXEAC
designator C?  Capacitance: 1000pF  (hidden comment: *)
Capacitor, Ceramic (MLCC), 1000pF, ±10%, 500V, X7R, ±10%, SMD 1206; Manufacturer: Vishay Intertech; Manufacturer Part Number: VJ1206Y102KXEAC; Package Size: 1206; JLCPCB Basic Part: No; JLCPCB Part Number: C2176103; Supplier 1: LCSC; Category: Capacitors - MLCC; Supplier Part Number 1: C2176103; Tolerance: ±10%; Voltage Rating: 500V; Temperature Coefficient: X7R; RoHS: Yes; ComponentLink1Description: Datasheet; ComponentLink1URL: https://wmsc.lcsc.com/wmsc/upload/file/pdf/v2/lcsc/2206291630_Vishay-Intertech-VJ1206Y102KXEAC_C2176103.pdf; ComponentLink2Description: JLCPCB Part URL; ComponentLink2URL: https://jlcpcb.com/partdetail/C2176103; ComponentLink3Description: LCSC Part URL; ComponentLink3URL: https://lcsc.com/product-detail/Multilayer-Ceramic-Capacitors-MLCC---SMD-SMT_Vishay-Intertech-Vishay-Intertech-VJ1206Y102KXEAC_C2176103.html
footprint CAP-1206 (1206 (3216M) Capacitor)
pins: 1, 2

## VJ1206Y102MXFAT4X
designator C?  Capacitance: 1nF  (hidden comment: *)
Capacitor, Ceramic (MLCC), 1nF, ±20%, 2kV, X7R, ±20%, SMD 1206; Manufacturer: Vishay Intertech; Manufacturer Part Number: VJ1206Y102MXFAT4X; Package Size: 1206; JLCPCB Basic Part: No; JLCPCB Part Number: C3013812; Supplier 1: LCSC; Category: Capacitors - MLCC; Supplier Part Number 1: C3013812; Tolerance: ±20%; Voltage Rating: 2kV; Temperature Coefficient: X7R; RoHS: Yes; ComponentLink1Description: Datasheet; ComponentLink1URL: https://wmsc.lcsc.com/wmsc/upload/file/pdf/v2/lcsc/2206021745_Vishay-Intertech-VJ1206Y102MXFAT4X_C3013812.pdf; ComponentLink2Description: JLCPCB Part URL; ComponentLink2URL: https://jlcpcb.com/partdetail/C3013812; ComponentLink3Description: LCSC Part URL; ComponentLink3URL: https://lcsc.com/product-detail/Multilayer-Ceramic-Capacitors-MLCC---SMD-SMT_Vishay-Intertech-Vishay-Intertech-VJ1206Y102MXFAT4X_C3013812.html
footprint CAP-1206 (1206 (3216M) Capacitor)
pins: 1, 2